# Altium footprint library ProgettoAgrifoodLibreriaPCB.PcbLib: 54 footprints (part 1 of 4)
Each footprint in its own frame and in the unit in brackets; x right, y up, seen from the top. Pads: shape width x height; smd on the part's side, far side on the other; paste and mask are expansions set on the pad; w line width, h text height; cw(c..) or ccw(c..) is an arc to the next point about the centre after c.
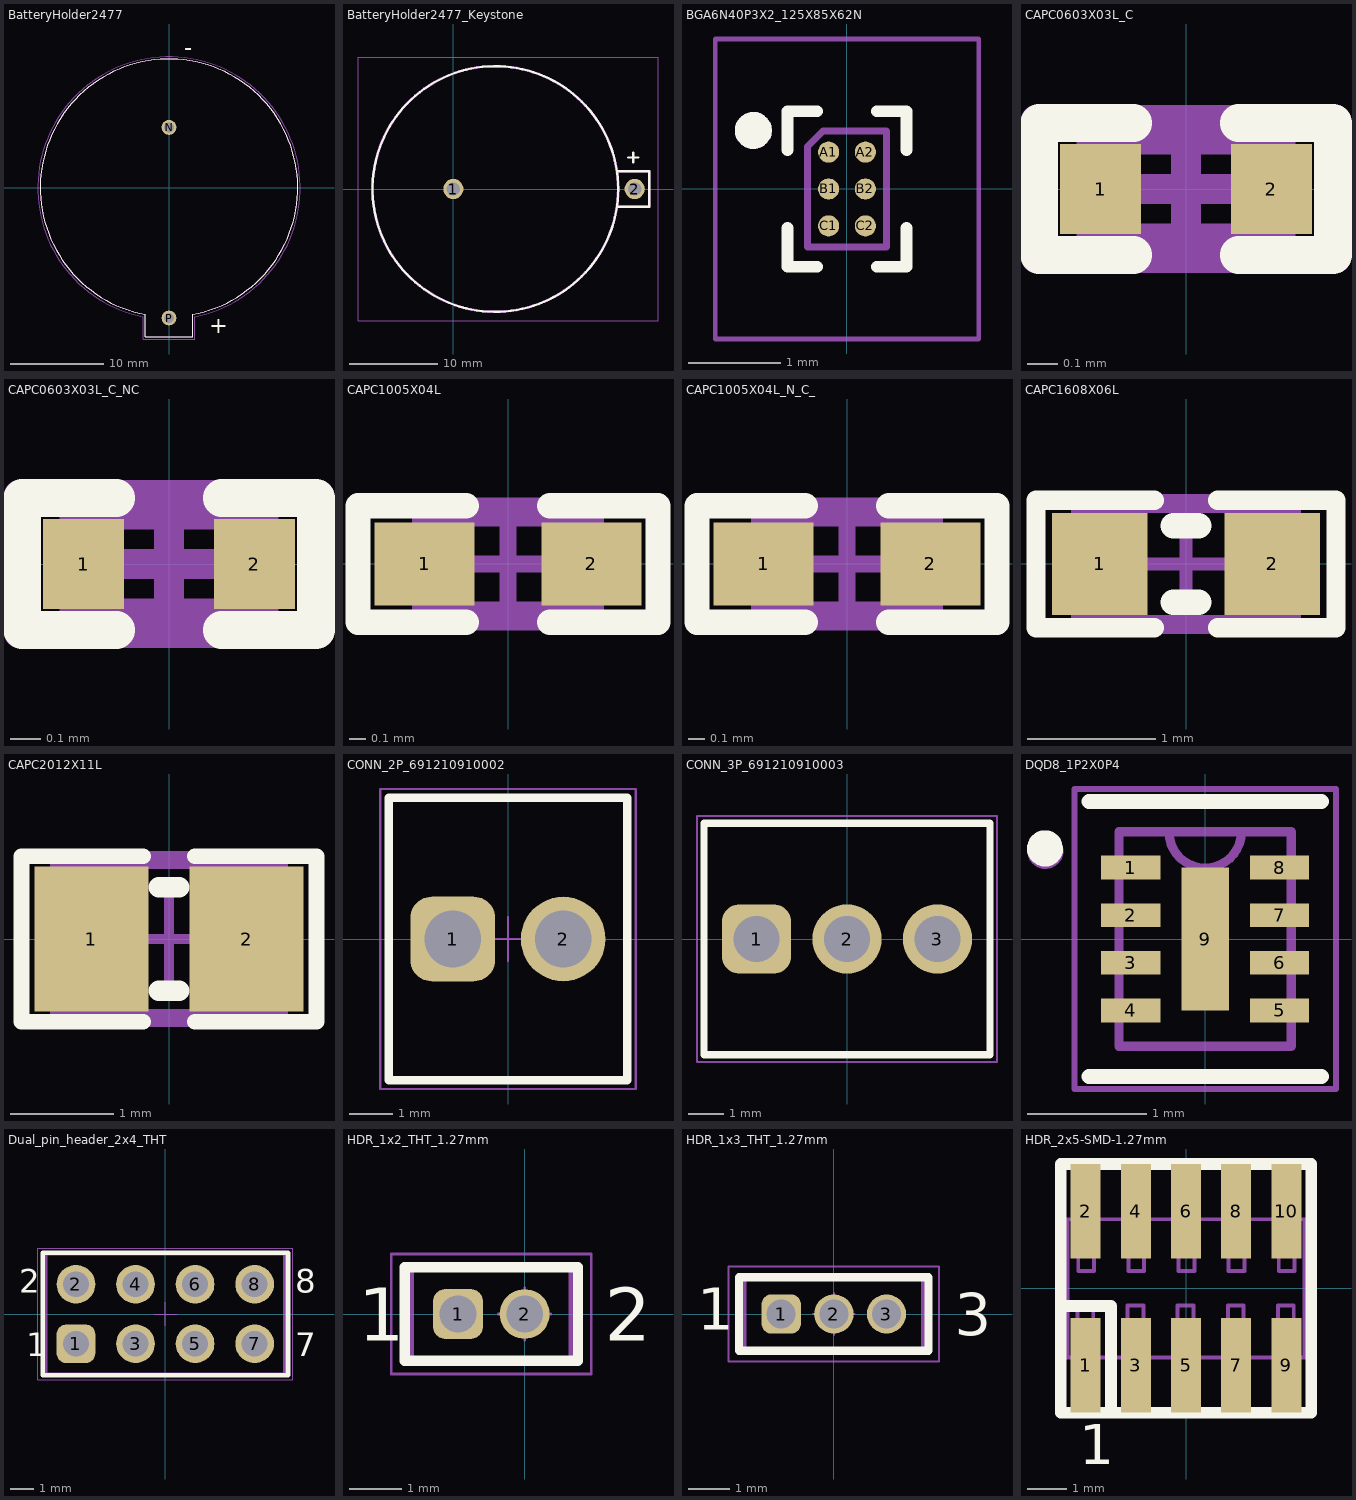
[diagram p0: the footprints below, top view; thin cyan lines are the x and y axes]

## BatteryHolder2477 [mil]
pads (2):
  round 63 hole 42: N(0,255.91) P(0,-551.18)
Top Overlay:
  lines w5: -100,-536.02 -100,-630.12 100,-630.12 100,-536.02 ; -99.81,-536.06 cw(c0,-0.13) 99.81,-536.06
  text "+" at 170,-615 h70
  text "-" at 65,560 h70
Top Courtyard:
  lines w1.97: -110.16,-545.8 cw(c0,-1.11) 110.16,-545.8 ; -109.84,-545.87 -109.84,-639.96 109.84,-639.96 109.84,-545.87
Top Assembly:
  lines w5: -100,-536.02 -100,-630.12 100,-630.12 100,-536.02 ; -99.81,-536.06 cw(c0,-0.13) 99.81,-536.06
  text "-" at 50,310 h70
  text "+" at 35,-475 h70
  text ".Designator" at -310,-15.01 h60
3D body "BH1000G--3DModel-STEP-56544.STEP": height 540, standoff -160, extent -545,-630 545,545

## BatteryHolder2477_Keystone [mm]
pads (2):
  round 2.28 hole 1.52: 1(0,0) 2(20.49,0)
Top Overlay:
  circle w0.254: c4.745,0 r13.88
  lines w0.254: 18.505,-2 22.125,-2 22.125,2 18.505,2 ; 19.738,3.556 20.881,3.556 ; 20.32,2.992 20.32,4.135
Top Assembly:
  circle w0.305: c4.745,0 r13.88
  lines w0.305: 18.505,-2 22.125,-2 22.125,2 18.505,2
  text ".Designator" at -2.794,3.56 h1.52
Bottom Assembly:
  lines w0.1: -10.775,-14.88 23.125,-14.88 23.125,14.88 -10.775,14.88 -10.775,-14.88
3D body "1025-7.stp": height 12.73, standoff -4.63, extent -9.01,-13.88 21.95,13.88

## BGA6N40P3X2_125X85X62N [mm]
pads (6):
  round 0.23 smd mask+0.05: A1(-0.2,0.4) A2(0.2,0.4) B1(-0.2,0) B2(0.2,0) C1(-0.2,-0.4) C2(0.2,-0.4)
Top Overlay:
  circle w0.2: c-1.016,0.635 r0.1
  lines w0.127: -0.645,-0.423 -0.645,-0.845 -0.323,-0.845 ; -0.645,0.423 -0.645,0.845 -0.323,0.845 ; 0.323,-0.845 0.645,-0.845 0.645,-0.423 ; 0.323,0.845 0.645,0.845 0.645,0.423
Top Courtyard:
  lines w0.05: -1.428,-1.627 -1.428,1.627 1.428,1.627 1.428,-1.627 -1.428,-1.627
Top Assembly:
  circle w0.2: c-1.016,0.635 r0.1
  circle w0.2: c-1.016,0.635 r0.1
  lines w0.076: -0.427,-0.627 -0.427,0.462 -0.262,0.627 0.427,0.627 0.427,-0.627 -0.427,-0.627
  text ".Designator" at 0.203,-0.265 h0.5
3D body "step_temp.STEP": height 0.63, standoff 0, extent -0.427,-0.627 0.427,0.627

## CAPC0603X03L_C [mm]
pads (2):
  rect 0.27x0.3 smd mask+0.05: 1(-0.285,0) 2(0.285,0)
Top Overlay:
  lines w0.125: -0.175,-0.22 -0.49,-0.22 -0.49,0.22 -0.175,0.22 ; 0.175,-0.22 0.49,-0.22 0.49,0.22 0.175,0.22
Top Courtyard:
  lines w0.1: -0.165,0 0.165,0 ; 0,-0.165 0,0.165 ; -0.5,-0.23 0.5,-0.23 0.5,0.23 -0.5,0.23 -0.5,-0.23
Top Assembly:
  lines w0.1: -0.315,-0.165 -0.315,0.165 0.315,0.165 0.315,-0.165 -0.315,-0.165
  text ".Designator" at -0.335,0.296 h0.3
3D body "User Library-0201(0603M) Cap.step": height 0.3, standoff -0.01, extent -0.305,-0.152 0.305,0.152

## CAPC0603X03L_C_NC [mm]
pads (2):
  rect 0.27x0.3 smd mask+0.05: 1(-0.285,0) 2(0.285,0)
Top Overlay:
  lines w0.125: -0.175,-0.22 -0.49,-0.22 -0.49,0.22 -0.175,0.22 ; 0.175,-0.22 0.49,-0.22 0.49,0.22 0.175,0.22
Top Courtyard:
  lines w0.1: -0.165,0 0.165,0 ; 0,-0.165 0,0.165 ; -0.5,-0.23 -0.5,0.23 0.5,0.23 0.5,-0.23 -0.5,-0.23
Top Assembly:
  lines w0.1: -0.315,-0.165 0.315,-0.165 0.315,0.165 -0.315,0.165 -0.315,-0.165
  text ".Designator" at -0.335,0.296 h0.3

## CAPC1005X04L [mm]
pads (2):
  rect 0.6x0.5 smd: 1(-0.5,0) 2(0.5,0)
Top Overlay:
  lines w0.152: -0.25,-0.35 -0.9,-0.35 -0.9,0.35 -0.25,0.35 ; 0.25,-0.35 0.9,-0.35 0.9,0.35 0.25,0.35
Top Courtyard:
  lines w0.1: -0.275,0 0.275,0 ; 0,-0.275 0,0.275 ; -0.9,-0.35 -0.9,0.35 0.9,0.35 0.9,-0.35 -0.9,-0.35
Top Assembly:
  lines w0.1: -0.525,-0.275 0.525,-0.275 0.525,0.275 -0.525,0.275 -0.525,-0.275
  text ".Designator" at -0.432,-0.152 h0.3
3D body "User Library-0402(1005M) Cap.step": height 0.5, standoff -0.01, extent -0.508,-0.254 0.508,0.254

## CAPC1005X04L_N_C_ [mm]
pads (2):
  rect 0.6x0.5 smd: 1(-0.5,0) 2(0.5,0)
Top Overlay:
  lines w0.152: -0.25,-0.35 -0.9,-0.35 -0.9,0.35 -0.25,0.35 ; 0.25,-0.35 0.9,-0.35 0.9,0.35 0.25,0.35
Top Courtyard:
  lines w0.1: -0.275,0 0.275,0 ; 0,-0.275 0,0.275 ; -0.9,-0.35 0.9,-0.35 0.9,0.35 -0.9,0.35 -0.9,-0.35
Top Assembly:
  lines w0.1: -0.525,-0.275 -0.525,0.275 0.525,0.275 0.525,-0.275 -0.525,-0.275
  text ".Designator" at -0.432,-0.152 h0.3

## CAPC1608X06L [mm]
pads (2):
  rect 0.75x0.8 smd: 1(-0.675,0) 2(0.675,0)
Top Overlay:
  lines w0.152: -0.25,-0.5 -1.175,-0.5 -1.175,0.5 -0.25,0.5 ; 0.25,-0.5 1.175,-0.5 1.175,0.5 0.25,0.5
  lines w0.2: -0.1,-0.3 0.1,-0.3 ; -0.1,0.3 0.1,0.3
Top Courtyard:
  lines w0.1: -0.45,0 0.45,0 ; 0,-0.45 0,0.45 ; -1.175,-0.5 -1.175,0.5 1.175,0.5 1.175,-0.5 -1.175,-0.5
Top Assembly:
  lines w0.1: -0.85,-0.45 0.85,-0.45 0.85,0.45 -0.85,0.45 -0.85,-0.45
  text ".Designator" at -0.711,-0.152 h0.3
3D body "User Library-Chip Capacitor 0603.step": height 0.8, standoff 0, extent -0.8,-0.43 0.8,0.43

## CAPC2012X11L [mm]
pads (2):
  rect 1.1x1.4 smd: 1(-0.75,0) 2(0.75,0)
Top Overlay:
  lines w0.152: -0.25,-0.8 -1.425,-0.8 -1.425,0.8 -0.25,0.8 ; 0.25,-0.8 1.425,-0.8 1.425,0.8 0.25,0.8
  lines w0.2: -0.1,-0.5 0.1,-0.5 ; -0.1,0.5 0.1,0.5
Top Courtyard:
  lines w0.1: -0.5,0 0.5,0 ; 0,-0.5 0,0.5 ; -1.425,-0.8 -1.425,0.8 1.425,0.8 1.425,-0.8 -1.425,-0.8
Top Assembly:
  lines w0.1: -1.1,-0.725 1.1,-0.725 1.1,0.725 -1.1,0.725 -1.1,-0.725
  text ".Designator" at -0.889,1.143 h0.8
3D body "SW3dPS-0805 SMD Capacitor.STEP": height 0.77, standoff -0.01, extent -1,-0.625 1,0.625

## CONN_2P_691210910002 [mm] "2,54mm - modular - green - Horizontal wire entry - Cage clamp - 0,8mm2 wires - 02p"
height 8.5
pads (2):
  rrect50% 1.95x1.95 hole 1.3: 1(-1.27,0)
  round 1.95 hole 1.3: 2(1.27,0)
Top Overlay:
  lines w0.2: -2.74,-3.25 -2.74,3.25 2.74,3.25 2.74,-3.25 -2.74,-3.25
Top Courtyard:
  lines w0.05: -0.5,0 0.5,0 ; 0,-0.5 0,0.5 ; -2.94,-3.45 2.94,-3.45 2.94,3.45 -2.94,3.45 -2.94,-3.45
Top Assembly:
  lines w0.1: -2.74,-3.25 -2.74,3.25 2.74,3.25 2.74,-3.25 -2.74,-3.25
  text ".Designator" at -7.498,-0.5 h1.5
3D body "691210910002.stp": height 8.55, standoff -3.45, extent -2.74,-3.25 2.74,3.25

## CONN_3P_691210910003 [mm] "2,54mm - modular - green - Horizontal wire entry - Cage clamp - 0,8mm2 wires - 03p"
height 8.5
pads (3):
  rrect50% 1.95x1.95 hole 1.3: 1(-2.54,0)
  round 1.95 hole 1.3: 2(0,0) 3(2.54,0)
Top Overlay:
  lines w0.2: -4.01,-3.25 4.01,-3.25 4.01,3.25 -4.01,3.25 -4.01,-3.25
Top Courtyard:
  lines w0.05: -0.5,0 0.5,0 ; 0,-0.5 0,0.5 ; -4.21,-3.45 -4.21,3.45 4.21,3.45 4.21,-3.45 -4.21,-3.45
Top Assembly:
  lines w0.1: -4.01,-3.25 -4.01,3.25 4.01,3.25 4.01,-3.25 -4.01,-3.25
  text ".Designator" at -7.498,-0.5 h1.5
3D body "691210910003.stp": height 8.55, standoff -3.45, extent -4.01,-3.25 4.01,3.25

## DQD8_1P2X0P4 [mm]
pads (9):
  rect 0.5x0.2 smd paste-0.1 mask+0.05: 1(-0.625,0.6) 2(-0.625,0.2) 3(-0.625,-0.2) 4(-0.625,-0.6) 5(0.625,-0.6) 6(0.625,-0.2) 7(0.625,0.2) 8(0.625,0.6)
  rect 0.4x1.2 smd paste-0.2 mask+0.04: 9(0,0)
Top Layer:
  region: 0,0.6
  region: 0,-0.6
Top Overlay:
  lines w0.127: -0.978,-1.156 0.978,-1.156 ; -0.978,1.156 0.978,1.156
  lines w0.152: -1.278,0.796 ccw(c-1.346,0.762) -1.27,0.762
Top Paste:
  region: -0.375,0.3 -0.875,0.3 -0.875,0.1 -0.375,0.1
  region: -0.375,-0.1 -0.875,-0.1 -0.875,-0.3 -0.375,-0.3
  region: -0.375,-0.5 -0.875,-0.5 -0.875,-0.7 -0.375,-0.7
  region: 0.875,-0.5 0.375,-0.5 0.375,-0.7 0.875,-0.7
  region: 0.875,-0.1 0.375,-0.1 0.375,-0.3 0.875,-0.3
  region: 0.875,0.3 0.375,0.3 0.375,0.1 0.875,0.1
  region: 0.875,0.7 0.375,0.7 0.375,0.5 0.875,0.5
  region: 0.152,0.559 -0.152,0.559 -0.152,0.051 0.152,0.051
  region: 0.152,-0.051 -0.152,-0.051 -0.152,-0.559 0.152,-0.559
  region: -0.375,0.7 -0.875,0.7 -0.875,0.5 -0.375,0.5
Top Solder:
  region: -0.325,0.75 -0.925,0.75 -0.925,0.45 -0.325,0.45
  region: -0.325,0.35 -0.925,0.35 -0.925,0.05 -0.325,0.05
  region: -0.325,-0.05 -0.925,-0.05 -0.925,-0.35 -0.325,-0.35
  region: -0.325,-0.45 -0.925,-0.45 -0.925,-0.75 -0.325,-0.75
  region: 0.925,-0.45 0.325,-0.45 0.325,-0.75 0.925,-0.75
  region: 0.925,-0.05 0.325,-0.05 0.325,-0.35 0.925,-0.35
  region: 0.925,0.35 0.325,0.35 0.325,0.05 0.925,0.05
  region: 0.925,0.75 0.325,0.75 0.325,0.45 0.925,0.45
  region: 0.102,0.702 -0.102,0.702 0.102,0.702
  region: 0.102,-0.702 -0.102,-0.702 0.102,-0.702
Top Courtyard:
  lines w0.05: -1.1,-1.26 -1.1,1.26 1.1,1.26 1.1,-1.26 -1.1,-1.26
Top Assembly:
  lines w0.076: -0.305,0.902 ccw(c0,0.902) 0.305,0.902 ; -0.724,-0.902 -0.724,0.902 0.724,0.902 0.724,-0.902 -0.724,-0.902
  lines w0.152: -1.276,0.776 ccw(c-1.344,0.742) -1.268,0.742
3D body: height 0.25, standoff 0, extent 0,0 0.254,0.254
3D body "DQD0008A.stp": height 0.8, standoff 0, extent -0.675,-0.85 0.675,0.85

## Dual_pin_header_2x4_THT [mm] "Pin Header, pitch 2.54 mm, THT, Vertical, dual row, 8p"
height 8.54
pads (8):
  rrect50% 1.65x1.65 hole 1.1: 1(-3.81,-1.27)
  round 1.65 hole 1.1: 2(-3.81,1.27) 3(-1.27,-1.27) 4(-1.27,1.27) 5(1.27,-1.27) 6(1.27,1.27) 7(3.81,-1.27) 8(3.81,1.27)
Top Overlay:
  lines w0.2: -5.23,-2.615 -5.23,2.615 5.23,2.615 5.23,-2.615 -5.23,-2.615
  text "1" at -5.94,-1.8 h1.02
  text "2" at -6.24,0.9 h1.02
  text "7" at 5.54,-1.8 h1.02
  text "8" at 5.54,0.9 h1.02
Top 3D Body:
  lines w0.1: -5.08,-2.54 -5.08,2.54 5.08,2.54 5.08,-2.54 -5.08,-2.54
Top Courtyard:
  lines w0.05: -0.5,0 0.5,0 ; 0,-0.5 0,0.5 ; -5.43,-2.815 5.43,-2.815 5.43,2.815 -5.43,2.815 -5.43,-2.815
Top Designator:
  text ".Designator" at -7.498,-0.5 h1.5
Top Component Outline:
  lines w0.1: -5.08,-2.54 -5.08,2.54 5.08,2.54 5.08,-2.54 -5.08,-2.54
3D body "61300821121.stp": height 8.59, standoff -2.95, extent -5.08,-2.54 5.08,2.54

## HDR_1x2_THT_1.27mm [mm]
height 5.65
pads (2):
  rrect50% 0.95x0.95 hole 0.7: 1(-1.27,0)
  round 0.95 hole 0.7: 2(0,0)
Top Overlay:
  lines w0.2: -2.286,-0.887 1.016,-0.887 1.016,0.887 -2.286,0.887 -2.286,-0.887
  text "2" at 1.524,-0.508 h1.02
  text "1" at -3.175,-0.508 h1.02
Top Courtyard:
  lines w0.05: -0.5,0 0.5,0 ; 0,-0.5 0,0.5 ; -2.54,-1.143 -2.54,1.143 1.27,1.143 1.27,-1.143 -2.54,-1.143
Top Assembly:
  lines w0.1: -2.159,-0.887 -2.159,0.887 0.889,0.887 0.889,-0.887 -2.159,-0.887
  text ".Designator" at -2.839,-2.365 h1

## HDR_1x3_THT_1.27mm [mm]
height 5.65
pads (3):
  rrect50% 0.95x0.95 hole 0.7: 1(-1.27,0)
  round 0.95 hole 0.7: 2(0,0) 3(1.27,0)
Top Overlay:
  lines w0.2: -2.286,-0.887 -2.286,0.887 2.286,0.887 2.286,-0.887 -2.286,-0.887
  text "1" at -3.302,-0.381 h1.02
  text "3" at 2.921,-0.508 h1.02
Top Courtyard:
  lines w0.05: -0.5,0 0.5,0 ; 0,-0.5 0,0.5 ; -2.54,-1.143 2.54,-1.143 2.54,1.143 -2.54,1.143 -2.54,-1.143
Top Assembly:
  lines w0.1: -2.159,-0.887 2.159,-0.887 2.159,0.887 -2.159,0.887 -2.159,-0.887
  text ".Designator" at -3.053,-2.786 h1.5

## HDR_2x5-SMD-1.27mm [mm]
pads (10):
  rect 0.76x2.4 smd: 1(-2.54,-1.95) 2(-2.54,1.95) 3(-1.27,-1.95) 4(-1.27,1.95) 5(0,-1.95) 6(0,1.95) 7(1.27,-1.95) 8(1.27,1.95) 9(2.54,-1.95) 10(2.54,1.95)
Top Overlay:
  lines w0.3: -3.175,-0.45 -1.9,-0.45 -1.9,-3.15 ; -3.175,-3.15 -3.175,3.15 3.175,3.15 3.175,-3.15 -3.175,-3.15
  text "1" at -2.7,-4.45 h1.02
Top Assembly:
  lines w0.1: -2.74,-1.75 -2.74,-2.459 ccw(c-2.54,-2.459) -2.34,-2.459 -2.34,-1.75 ; -2.74,1.75 -2.74,2.459 cw(c-2.54,2.459) -2.34,2.459 -2.34,1.75 ; -1.47,-1.75 -1.47,-2.459 ccw(c-1.27,-2.459) -1.07,-2.459 -1.07,-1.75 ; -1.47,1.75 -1.47,2.459 cw(c-1.27,2.459) -1.07,2.459 -1.07,1.75 ; -0.2,-1.75 -0.2,-2.459 ccw(c0,-2.459) 0.2,-2.459 0.2,-1.75 ; -0.2,1.75 -0.2,2.459 cw(c0,2.459) 0.2,2.459 0.2,1.75 ; 1.07,-1.75 1.07,-2.459 ccw(c1.27,-2.459) 1.47,-2.459 1.47,-1.75 ; 1.07,1.75 1.07,2.459 cw(c1.27,2.459) 1.47,2.459 1.47,1.75 ; 2.34,-1.75 2.34,-2.459 ccw(c2.54,-2.459) 2.74,-2.459 2.74,-1.75 ; 2.34,1.75 2.34,2.459 cw(c2.54,2.459) 2.74,2.459 2.74,1.75 ; -3,-1.75 -3,1.75 3,1.75 3,-1.75 -3,-1.75 ; -2.75,-0.835 -2.35,-0.835 -2.35,-0.435 -2.75,-0.435 -2.75,-0.835 ; -2.73,0.435 -2.33,0.435 -2.33,0.835 -2.73,0.835 -2.73,0.435 ; -1.48,-0.835 -1.08,-0.835 -1.08,-0.435 -1.48,-0.435 -1.48,-0.835 ; -1.46,0.435 -1.06,0.435 -1.06,0.835 -1.46,0.835 -1.46,0.435 ; -0.21,-0.835 -0.21,-0.435 0.19,-0.435 0.19,-0.835 -0.21,-0.835 ; -0.19,0.435 0.21,0.435 0.21,0.835 -0.19,0.835 -0.19,0.435 ; 1.06,-0.835 1.46,-0.835 1.46,-0.435 1.06,-0.435 1.06,-0.835 ; 1.08,0.435 1.48,0.435 1.48,0.835 1.08,0.835 1.08,0.435 ; 2.33,-0.835 2.73,-0.835 2.73,-0.435 2.33,-0.435 2.33,-0.835 ; 2.35,0.435 2.75,0.435 2.75,0.835 2.35,0.835 2.35,0.435
  text ".Designator" at 0,-0.762 h0.38
3D body "Samtec-FTS-105-01-F-DV.step": height 4.33, standoff 0.01, extent -3.165,-2.921 3.185,2.921